# Altium footprint library TarabusLib_KAP.PcbLib: 504 footprints (part 9 of 32)
Each footprint in its own frame and in the unit in brackets; x right, y up, seen from the top. Pads: shape width x height; smd on the part's side, far side on the other; paste and mask are expansions set on the pad; w line width, h text height; cw(c..) or ccw(c..) is an arc to the next point about the centre after c.
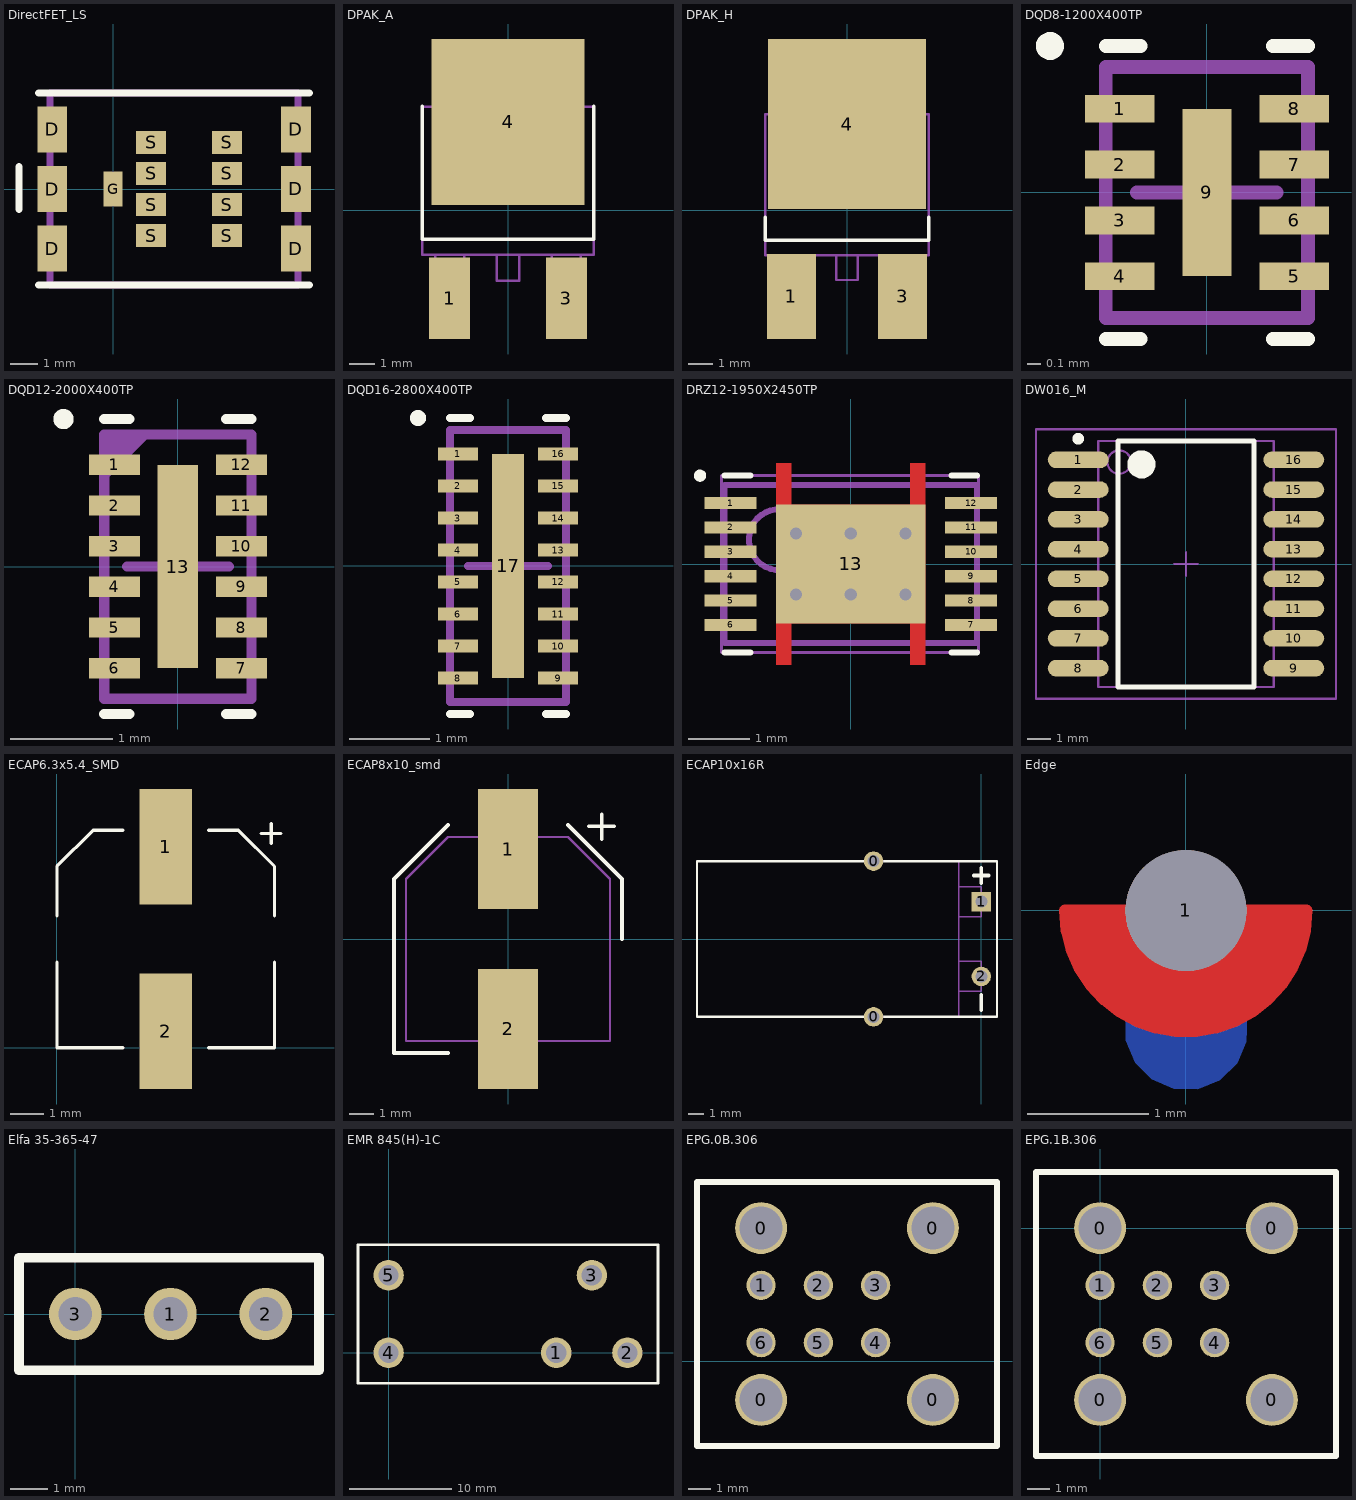
[diagram p8: the footprints below, top view; thin cyan lines are the x and y axes]

## DirectFET_LS [mm]
height 0.7
pads (15):
  rect 1.1x1.7 smd: D(-2.25,-2.2) D(-2.25,0) D(-2.25,2.2) D(6.75,-2.2) D(6.75,0) D(6.75,2.2)
  rect 0.7x1.3 smd: G(0,0)
  rect 1.1x0.85 smd: S(1.4,-1.725) S(1.4,-0.575) S(1.4,0.575) S(1.4,1.725) S(4.2,-1.725) S(4.2,-0.575) S(4.2,0.575) S(4.2,1.725)
Top Overlay:
  lines w0.254: -3.475,-0.75 -3.475,0.825 ; -2.75,-3.55 7.25,-3.55 ; -2.75,3.55 7.25,3.55
Mechanical 7:
  lines w0.254: -2.325,-3.55 6.825,-3.55 6.825,3.55 -2.325,3.55 -2.325,-3.55
3D body: height 0.3, standoff 0.05, extent 6.125,-3 6.825,3.025
3D body: height 0.3, standoff 0.05, extent -2.3,-3 -1.6,3.025
3D body: height 0.7, standoff 0.05, extent -1.625,-3.55 6.125,3.55

## DPAK_A [mm]
height 2.4
pads (3):
  rect 1.6x3.2 smd: 1(-2.285,-3.45) 3(2.285,-3.45)
  rect 6x6.5 smd: 4(0,3.45)
Top Overlay:
  lines w0.15: -3.36,4.05 -3.36,-1.14 3.36,-1.14 3.36,4.05
Mechanical 7:
  lines w0.1: -2.855,-1.75 -2.855,-4.34 -1.715,-4.34 -1.715,-1.75 ; -2.73,4.05 -2.73,6.08 2.73,6.08 2.73,4.05 ; -0.44,-1.75 -0.44,-2.77 0.44,-2.77 0.44,-1.75 ; 1.715,-1.75 1.715,-4.34 2.855,-4.34 2.855,-1.75 ; -3.36,-1.75 -3.36,4.05 3.36,4.05 3.36,-1.75 -3.36,-1.75
Mechanical 10:
  text ".Designator" at -0.8,7.82 h0.8
  text ".Comment" at -0.73,7.09 h0.6
3D body: height 1.5, standoff 0.5, extent -0.44,-2.77 0.44,-1.75
3D body: height 1.5, standoff 0, extent 1.715,-4.34 2.855,-1.75
3D body: height 1.5, standoff 0, extent -2.855,-4.34 -1.715,-1.75
3D body: height 0.7, standoff 0, extent -2.73,4.05 2.73,6.08
3D body: height 2.4, standoff 0, extent -3.36,-1.75 3.36,4.05

## DPAK_H [mm]
height 2.4
pads (3):
  rect 2x3.5 smd: 1(-2.285,-3.55) 3(2.285,-3.55)
  rect 6.5x7 smd: 4(0,3.55)
Top Overlay:
  lines w0.15: -3.36,-0.3 -3.36,-1.24 3.36,-1.24 3.36,-0.3
Mechanical 7:
  lines w0.1: -2.855,-1.85 -2.855,-4.44 -1.715,-4.44 -1.715,-1.85 ; -2.73,3.95 -2.73,5.98 2.73,5.98 2.73,3.95 ; -0.44,-1.85 -0.44,-2.87 0.44,-2.87 0.44,-1.85 ; 1.715,-1.85 1.715,-4.44 2.855,-4.44 2.855,-1.85 ; -3.36,-1.85 -3.36,3.95 3.36,3.95 3.36,-1.85 -3.36,-1.85
Mechanical 10:
  text ".Comment" at -0.73,7.63 h0.6
  text ".Designator" at -0.85,8.28 h0.8
3D body: height 2.4, standoff 0, extent -3.36,-1.85 3.36,3.95
3D body: height 0.7, standoff 0, extent -2.73,3.95 2.73,5.98
3D body: height 1.5, standoff 0, extent -2.855,-4.44 -1.715,-1.85
3D body: height 1.5, standoff 0, extent 1.715,-4.44 2.855,-1.85
3D body: height 1.5, standoff 0.5, extent -0.44,-2.87 0.44,-1.85

## DQD8-1200X400TP [mm] "SON, 8-Leads, Body 1.35x1.7mm, Pitch 0.4mm, Thermal Pad 1.2x0.4mm, TI Recommended"
height 0.8
pads (9):
  rect 0.5x0.2 smd paste+0 mask+0.05: 1(-0.625,0.6) 2(-0.625,0.2) 3(-0.625,-0.2) 4(-0.625,-0.6) 5(0.625,-0.6) 6(0.625,-0.2) 7(0.625,0.2) 8(0.625,0.6)
  rect 0.35x1.2 smd paste-0.175 mask+0.05: 9(0,0)
Top Overlay:
  circle w0.1: c-1.125,1.05 r0.05
  lines w0.1: -0.725,-1.05 -0.475,-1.05 ; -0.725,1.05 -0.475,1.05 ; 0.475,-1.05 0.725,-1.05 ; 0.475,1.05 0.725,1.05
Top Paste:
  rectangle: -0.15,0.05 0.15,0.55
  region: 0.15,-0.05 -0.15,-0.05 -0.15,-0.55 0.15,-0.55
Mechanical 7:
  lines w0.05: -0.725,-0.9 0.725,-0.9 0.725,0.9 -0.725,0.9 -0.725,-0.9
  lines w0.1: -0.5,0 0.5,0 ; 0,-0.5 0,0.5
Mechanical 9:
  lines w0.1: -0.725,-0.9 0.725,-0.9 0.725,0.9 -0.725,0.9 -0.725,-0.9
Mechanical 10:
  text ".Designator" at -1.075,-1.65 h0.7
  text ".Comment" at -0.975,1.35 h0.7
3D body: height 0.8, standoff 0, extent -0.725,-0.9 0.725,0.9

## DQD12-2000X400TP [mm] "SON, 12-Leads, Body 1.35x2.5mm, Pitch 0.4mm, Thermal Pad 2x0.4mm, TI Recommended"
height 0.8
pads (13):
  rect 0.5x0.2 smd paste+0 mask+0.05: 1(-0.625,1) 2(-0.625,0.6) 3(-0.625,0.2) 4(-0.625,-0.2) 5(-0.625,-0.6) 6(-0.625,-1) 7(0.625,-1) 8(0.625,-0.6) 9(0.625,-0.2) 10(0.625,0.2) 11(0.625,0.6) 12(0.625,1)
  rect 0.4x2 smd paste-0.2 mask+0.05: 13(0,0)
Top Overlay:
  circle w0.1: c-1.125,1.45 r0.05
  lines w0.1: -0.725,-1.45 -0.475,-1.45 ; -0.725,1.45 -0.475,1.45 ; 0.475,-1.45 0.725,-1.45 ; 0.475,1.45 0.725,1.45
Top Paste:
  region: 0.15,-0.405 -0.15,-0.405 -0.15,-0.955 0.15,-0.955
  rectangle: -0.15,0.405 0.15,0.955
  rectangle: -0.15,-0.275 0.15,0.275
Mechanical 7:
  lines w0.05: -0.725,-1.3 -0.725,1.3 0.725,1.3 0.725,-1.3 -0.725,-1.3
  lines w0.1: -0.7,0.925 -0.35,1.275 ; -0.7,1.025 -0.45,1.275 ; -0.7,1.1 -0.525,1.275 ; -0.7,1.2 -0.625,1.275 ; -0.5,0 0.5,0 ; 0,-0.5 0,0.5
Mechanical 9:
  lines w0.1: -0.725,-1.3 -0.725,1.3 0.725,1.3 0.725,-1.3 -0.725,-1.3
Mechanical 10:
  text ".Designator" at -0.95,-2.05 h0.7
  text ".Comment" at -0.6,1.725 h0.7
3D body: height 0.8, standoff 0, extent -0.725,-1.3 0.725,1.3

## DQD16-2800X400TP [mm] "SON, 16-Leads, Body 1.35x3.3mm, Pitch 0.4mm, Thermal Pad 2.8x0.4mm, TI Recommended"
height 0.8
pads (17):
  rect 0.5x0.16 smd paste+0 mask+0.05: 1(-0.625,1.4) 2(-0.625,1) 3(-0.625,0.6) 4(-0.625,0.2) 5(-0.625,-0.2) 6(-0.625,-0.6) 7(-0.625,-1) 8(-0.625,-1.4) 9(0.625,-1.4) 10(0.625,-1) 11(0.625,-0.6) 12(0.625,-0.2) 13(0.625,0.2) 14(0.625,0.6) 15(0.625,1) 16(0.625,1.4)
  rect 0.4x2.8 smd paste-1.4 mask+0.05: 17(0,0)
Top Overlay:
  circle w0.1: c-1.125,1.85 r0.05
  lines w0.1: -0.725,-1.85 -0.475,-1.85 ; -0.725,1.85 -0.475,1.85 ; 0.475,-1.85 0.725,-1.85 ; 0.475,1.85 0.725,1.85
Top Paste:
  rectangle: -0.15,0.75 0.15,1.35
  region: 0.15,-0.75 -0.15,-0.75 -0.15,-1.35 0.15,-1.35
  region: 0.15,-0.05 -0.15,-0.05 -0.15,-0.65 0.15,-0.65
  rectangle: -0.15,0.05 0.15,0.65
Mechanical 7:
  lines w0.05: -0.725,-1.7 -0.725,1.7 0.725,1.7 0.725,-1.7 -0.725,-1.7
  lines w0.1: -0.5,0 0.5,0 ; 0,-0.5 0,0.5
Mechanical 9:
  lines w0.1: -0.725,-1.7 -0.725,1.7 0.725,1.7 0.725,-1.7 -0.725,-1.7
Mechanical 10:
  text ".Designator" at -0.85,-2.45 h0.7
  text ".Comment" at -0.875,2.15 h0.7
3D body: height 0.8, standoff 0, extent -0.725,-1.7 0.725,1.7

## DRZ12-1950X2450TP [mm] "SON, 12-Leads, Body 4x2.5mm, Pitch 0.4mm, Thermal Pad 1.95x2.45mm, TI Recommended"
height 1
pads (13):
  rect 0.85x0.2 smd paste-0.1 mask+0.05: 1(-1.975,1) 2(-1.975,0.6) 3(-1.975,0.2) 4(-1.975,-0.2) 5(-1.975,-0.6) 6(-1.975,-1) 7(1.975,-1) 8(1.975,-0.6) 9(1.975,-0.2) 10(1.975,0.2) 11(1.975,0.6) 12(1.975,1)
  rect 2.45x1.95 smd paste-0.975 mask+0.05: 13(0,0)
via 0.9,-0.5 diameter 0.5 hole 0.2
via 0.9,0.5 diameter 0.5 hole 0.2
via -0.9,0.5 diameter 0.5 hole 0.2
via 0,0.5 diameter 0.5 hole 0.2
via -0.9,-0.5 diameter 0.5 hole 0.2
via 0,-0.5 diameter 0.5 hole 0.2
Top Layer:
  region: -1.225,-1.65 -1.225,1.65 -0.975,1.65 -0.975,0.975 0.975,0.975 0.975,1.65 1.225,1.65 1.225,-1.65 0.975,-1.65 0.975,-0.975 -0.975,-0.975 -0.975,-1.65
Top Overlay:
  circle w0.1: c-2.475,1.45 r0.05
  lines w0.1: -2.075,-1.45 -1.65,-1.45 ; -2.075,1.45 -1.65,1.45 ; 1.65,-1.45 2.075,-1.45 ; 1.65,1.45 2.075,1.45
Top Paste:
  rectangle: -1.1,0.1 -0.1,0.9
  region: 1.1,0.9 0.1,0.9 0.1,0.1 1.1,0.1
  region: 1.1,-0.1 0.1,-0.1 0.1,-0.9 1.1,-0.9
  rectangle: -1.1,-0.9 -0.1,-0.1
  rectangle: -1.225,1.1 -0.975,1.625
  rectangle: -1.225,-1.625 -0.975,-1.1
  region: 1.225,-1.1 0.975,-1.1 0.975,-1.625 1.225,-1.625
  region: 1.225,1.625 0.975,1.625 0.975,1.1 1.225,1.1
  lines w0.2: -2.275,-1 -1.675,-1 ; -2.275,-0.6 -1.675,-0.6 ; -2.275,-0.2 -1.675,-0.2 ; -2.275,0.2 -1.675,0.2 ; -2.275,0.6 -1.675,0.6 ; -2.275,1 -1.675,1 ; 1.675,-1 2.275,-1 ; 1.675,-0.6 2.275,-0.6 ; 1.675,-0.2 2.275,-0.2 ; 1.675,0.2 2.275,0.2 ; 1.675,0.6 2.275,0.6 ; 1.675,1 2.275,1
Mechanical 7:
  lines w0.05: -2.125,-1.45 -2.125,1.45 2.1,1.45 2.1,-1.45 -2.125,-1.45
  lines w0.1: -0.5,0 0.5,0 ; 0,-0.5 0,0.5
Mechanical 13:
  circle w0.1: c-1.175,0.4 r0.5
  lines w0.1: -2.075,-1.3 -2.075,1.3 2.075,1.3 2.075,-1.3 -2.075,-1.3
3D body: height 1, standoff 0, extent -2.075,-1.3 2.075,1.3

## DW016_M [mm] "16-Pin Plastic Small Outline Integrated Circuit 1.27 mm Pitch, IPC Low Density"
height 2.65
pads (16):
  oval 2.6x0.7 smd: 1(-4.6,4.445) 2(-4.6,3.175) 3(-4.6,1.905) 4(-4.6,0.635) 5(-4.6,-0.635) 6(-4.6,-1.905) 7(-4.6,-3.175) 8(-4.6,-4.445) 9(4.6,-4.445) 10(4.6,-3.175) 11(4.6,-1.905) 12(4.6,-0.635) 13(4.6,0.635) 14(4.6,1.905) 15(4.6,3.175) 16(4.6,4.445)
Top Overlay:
  circle w0.25: c-4.6,5.345 r0.125
  circle w0.6: c-1.9,4.25 r0.3
  lines w0.2: -2.9,-5.25 -2.9,5.25 2.9,5.25 2.9,-5.25 -2.9,-5.25
Mechanical 13:
  circle w0.1: c-2.85,4.35 r0.5
  lines w0.1: -3.75,-5.25 -3.75,5.25 3.75,5.25 3.75,-5.25 -3.75,-5.25
Mechanical 15:
  lines w0.1: -0.5,0 0.5,0 ; 0,-0.5 0,0.5 ; -6.4,-5.75 -6.4,5.75 6.4,5.75 6.4,-5.75 -6.4,-5.75
3D body: height 2.65, standoff 0, extent -3.75,-5.25 3.75,5.25

## ECAP6.3x5.4_SMD [mm] "Электролитический конденсатор SMD"
height 6
pads (2):
  rect 1.6x3.5 smd: 1(3.3,6.1) 2(3.3,0.5)
Top Overlay:
  lines w0.1: 0,2.6 0,0 2,0 ; 0,4 0,5.5 1.1,6.6 2,6.6 ; 4.6,0 6.6,0 6.6,2.6 ; 4.6,6.6 5.5,6.6 6.6,5.5 6.6,4 ; 6.2,6.5 6.8,6.5 ; 6.5,6.2 6.5,6.8
3D body: height 5.4, standoff 0, extent 0.175,0.156 6.45,6.444
3D body: height 1.5, standoff 0, extent 0,0 6.6,6.6

## ECAP8x10_smd [mm]
height 10
pads (2):
  rect 2.5x5 smd: 1(0,3.75) 2(0,-3.75)
Top Overlay:
  lines w0.15: -2.5,-4.75 -4.75,-4.75 -4.75,-4.25 -4.75,2.5 -2.5,4.75 ; 2.5,4.75 4.75,2.5 4.75,0 ; 3.375,4.7 4.425,4.7 ; 3.9,4.15 3.9,5.2
Mechanical 7:
  lines w0.1: -4.25,-4.25 -4.25,2.5 -2.5,4.25 2.5,4.25 4.25,2.5 4.25,-4.25 -4.25,-4.25
Mechanical 10:
  text ".Comment" at -1.125,-0.7 h0.6
  text ".Designator" at -1.05,0.3 h0.8
3D body "User Library-ALU-F.STEP": height 10.2, standoff 0, extent -4.15,-4.95 4.15,4.95

## ECAP10x16R [mm]
height 10
pads (4):
  round 1.3 hole 0.8: 0(-7.2,-5.2) 0(-7.2,5.2) 2(0,-2.5)
  rect 1.3x1.3 hole 0.8: 1(0,2.5)
Top Overlay:
  lines w0.15: -19,-5.2 1.05,-5.2 1.05,5.2 -19,5.2 -19,-5.2
  lines w0.254: -0.5,4.25 0.5,4.25 ; 0,-4.75 0,-3.75 ; 0,3.75 0,4.75
Mechanical 7:
  lines w0.1: -1.5,-3.5 0,-3.5 0,-1.5 -1.5,-1.5 ; -1.5,1.5 0,1.5 0,3.5 -1.5,3.5 ; -19,-5.2 -19,5.2 -1.5,5.2 -1.5,-5.2 -19,-5.2
Mechanical 10:
  text ".Comment" at -5.875,-1.2 h0.6
  text ".Designator" at -5.8,-0.2 h0.8
3D body: height 5, standoff 0, extent -1.5,-3.5 0,-1.5
3D body: height 5, standoff 0, extent -1.5,1.5 0,3.5
3D body: height 10.39, standoff 0.01, extent -19,-5.2 -1.5,5.159

## Edge [mm]
pads (1):
  round 1 hole 1: 1(0,0)
Top Layer:
  region: -1,0 -1,-0.132 -0.932,-0.386 -0.8,-0.614 -0.614,-0.8 -0.386,-0.932 -0.132,-1 0.132,-1 0.386,-0.932 0.614,-0.8 0.8,-0.614 0.932,-0.386 1,-0.132 1,0
  lines w0.1: -1,0 ccw(c0,0) 1,0 ; -1,0 0,0 ; -1,0 0,0 ; 0,0 1,0 ; 0,0 1,0
Signal Layer 1:
  region: -0.998,0.006 -0.998,-0.126 -0.93,-0.38 -0.798,-0.609 -0.612,-0.795 -0.384,-0.926 -0.13,-0.994 0.134,-0.994 0.388,-0.926 0.616,-0.795 0.802,-0.609 0.934,-0.38 1.002,-0.126 1.002,0.005 1.002,0.006
  lines w0.1: -0.998,0.006 ccw(c0.002,0.006) 1.002,0.006 ; -0.998,0.006 0.002,0.006 ; -0.998,0.006 0.002,0.006 ; 0.002,0.006 1.002,0.006 ; 0.002,0.006 1.002,0.006
Signal Layer 2:
  region: -0.998,0.006 -0.998,-0.126 -0.93,-0.38 -0.798,-0.609 -0.612,-0.795 -0.384,-0.926 -0.13,-0.994 0.134,-0.994 0.388,-0.926 0.616,-0.795 0.802,-0.609 0.934,-0.38 1.002,-0.126 1.002,0.005 1.002,0.006
  lines w0.1: -0.998,0.006 ccw(c0.002,0.006) 1.002,0.006 ; -0.998,0.006 0.002,0.006 ; -0.998,0.006 0.002,0.006 ; 0.002,0.006 1.002,0.006 ; 0.002,0.006 1.002,0.006
Bottom Layer:
  region: -0.497,-0.977 -0.497,-1.076 -0.421,-1.259 -0.282,-1.4 -0.1,-1.477 0.098,-1.478 0.282,-1.405 0.423,-1.267 0.502,-1.085 0.504,-0.986 0.504,0.014 -0.496,0.014

## Elfa 35-365-47 [mm]
pads (3):
  round 1.4 hole 0.9: 1(2.54,0) 2(5.08,0) 3(0,0)
Top Overlay:
  lines w0.254: -1.5,-1.5 -1.5,1.5 6.5,1.5 6.5,-1.5 -1.5,-1.5

## EMR 845(H)-1C [mm]
pads (5):
  round 3 hole 2: 1(16.5,0) 2(23.5,0) 3(20,7.6) 4(0,0) 5(0,7.6)
Top Overlay:
  lines w0.254: -3,-3 -3,10.5 -3,10.6 26.5,10.6 26.5,10.5 26.5,7.5 26.5,-3 -3,-3
3D body "845(H)-1C.STEP": height 18.5, standoff -3.5, extent -2.587,-2.311 26.413,10.389

## EPG.0B.306 [mm]
pads (10):
  round 2.3 hole 1.9: 0(-13.5,-1.72) 0(-13.5,5.9) 0(-5.88,-1.72) 0(-5.88,5.9)
  round 1.3 hole 1: 1(-13.5,3.36) 2(-10.96,3.36) 3(-8.42,3.36) 4(-8.42,0.82) 5(-10.96,0.82) 6(-13.5,0.82)
Top Overlay:
  lines w0.254: -16.34,-3.76 -3.04,-3.76 -3.04,7.94 -16.34,7.94 -16.34,-3.76

## EPG.1B.306 [mm]
pads (10):
  round 2.3 hole 1.9: 0(0,-7.62) 0(0,0) 0(7.62,-7.62) 0(7.62,0)
  round 1.3 hole 1: 1(0,-2.54) 2(2.54,-2.54) 3(5.08,-2.54) 4(5.08,-5.08) 5(2.54,-5.08) 6(0,-5.08)
Top Overlay:
  lines w0.254: -2.84,-10.11 -2.84,2.49 10.46,2.49 10.46,-10.11 -2.84,-10.11